# Altium schematic symbol library IC_TI.SCHLIB: 1162 symbols (part 2 of 8) (continued)
## DP83848KSQ_NOPB (continued)

## DP83848TSQ_NOPB
designator U?
Integrated Circuit; Manufacturer_Name: Texas Instruments; Manufacturer_Part_Number: DP83848TSQ/NOPB; Datasheet Link: http://www.ti.com/lit/gpn/dp83848t; Height: 0.8mm; Mouser Part Number: 926-DP83848TSQ/NOPB; Mouser Price/Stock: https://www.mouser.com/Search/Refine.aspx?Keyword=926-DP83848TSQ%2FNOPB; RS Part Number: 7614760; RS Price/Stock: https://uk.rs-online.com/web/p/products/7614760
footprint QFN40_0.5-PAD(6X6) (QFN, 40-Leads, Body 6.2x6.2mm (max), Pitch 0.50mm, IPC Low Density)
pins: 1 IO_VDD, 2 TX_CLK, 3 TX_EN, 4 TXD_0, 5 TXD_1, 6 TXD_2, 7 TXD_3, 8 RESERVED_1, 9 RESERVED_2, 10 RESERVED_3, 11 RD-, 12 RD+, 13 AGND_1, 14 TD-, 15 TD+, 16 PFBIN1, 17 AGND_2, 18 AVDD33, 19 PFBOUT, 20 RBIAS, 21 LED_SPEED/AN1, 22 LED_LINK/AN0, 23 RESET_N, 24 MDIO, 25 MDC, 26 IOVDD33, 27 X2, 28 X1, 29 DGND, 30 PFBIN2, 31 RX_CLK, 32 RX_DV/MII_MODE, 33 CRS/CRS_DV/LED_CFG, 34 RX_ER/MDIX_EN, 35 COL/PHYAD0, 36 RXD_0/PHYAD1, 37 RXD_1/PHYAD2, 38 RXD_2/PHYAD3, 39 RXD_3/PHYAD4, 40 IOGND, 41 EPAD

## DRV632PWR
designator U?
Integrated Circuit; Manufacturer_Name: Texas Instruments; Manufacturer_Part_Number: DRV632PWR; Datasheet Link: http://www.ti.com/lit/gpn/drv632; Mouser Part Number: 595-DRV632PWR; Mouser Price/Stock: https://www.mouser.com/Search/Refine.aspx?Keyword=595-DRV632PWR
footprint TSSOP14_0.65 (TSOP, 14-Leads, Body 5.00x4.40mm, Pitch 0.65mm, Thermal Pad 2.31x2.46mm, IPC Low Density)
pins: 1 +INR, 2 -INR, 3 OUTR, 4 GND_2, 5 ~MUTE, 6 VSS, 7 CN, 8 CP, 9 VDD, 10 GND, 11 UVP, 12 OUTL, 13 -INL, 14 +INL

## DRV2605LDGST
designator U?
Integrated Circuit; Manufacturer_Name: Texas Instruments; Manufacturer_Part_Number: DRV2605LDGST; Datasheet Link: http://www.ti.com/lit/ds/symlink/drv2605l.pdf; Height: 1.1mm; Mouser Part Number: 595-DRV2605LDGST; Mouser Price/Stock: https://www.mouser.com/Search/Refine.aspx?Keyword=595-DRV2605LDGST; RS Part Number: 9142942P; RS Price/Stock: http://uk.rs-online.com/web/p/products/9142942P
footprint VSSOP10_0.5
pins: 1 REG, 2 SCL, 3 SDA, 4 IN/TRIG, 5 EN, 6 VDD/NC, 7 OUT+, 8 GND, 9 OUT-, 10 VDD

## DRV5053VAQDBZR
designator U?
Integrated Circuit; Manufacturer_Name: Texas Instruments; Manufacturer_Part_Number: DRV5053VAQDBZR; Datasheet Link: http://www.ti.com/lit/ds/symlink/drv5053.pdf; Height: 1.12mm; Mouser Part Number: 595-DRV5053VAQDBZR; Mouser Price/Stock: https://www.mouser.com/Search/Refine.aspx?Keyword=595-DRV5053VAQDBZR
footprint SOT23-3 (贴片MOS的SOT-23封装)
pins: 1 VCC, 2 OUT, 3 GND

## DRV8313PWP
designator U?
Integrated Circuit; Manufacturer_Name: Texas Instruments; Manufacturer_Part_Number: DRV8313PWP; Datasheet Link: http://www.ti.com/lit/gpn/drv8313; Height: 1.2mm; Mouser Part Number: 595-DRV8313PWP; Mouser Price/Stock: https://www.mouser.com/Search/Refine.aspx?Keyword=595-DRV8313PWP; RS Part Number: 1457432; RS Price/Stock: http://uk.rs-online.com/web/p/products/1457432
footprint TSSOP28_0.65-PAD
pins: 1 CPL, 2 CPH, 3 VCP, 4 VM_1, 5 OUT1, 6 PGND1, 7 PGND2, 8 OUT2, 9 OUT3, 10 PGND3, 11 VM_2, 12 COMPP, 13 COMPN, 14 GND_1, 15 V3P3, 16 NRESET, 17 NSLEEP, 18 NFAULT, 19 NCOMPO, 20 GND_2, 21 NC, 22 EN3, 23 IN3, 24 EN2, 25 IN2, 26 EN1, 27 IN1, 28 GND_3, 29 POWERPAD

## DRV8313RHHR
designator U?
Integrated Circuit; Manufacturer_Name: Texas Instruments; Manufacturer_Part_Number: DRV8313RHHR; Datasheet Link: http://www.ti.com/lit/ds/symlink/drv8313.pdf; Height: 1mm; Mouser Part Number: 595-DRV8313RHHR; Mouser Price/Stock: https://www.mouser.com/Search/Refine.aspx?Keyword=595-DRV8313RHHR
footprint QFN36_0.5-PAD(6X6)
pins: 1 EN1, 2 IN1, 3 GND_1, 4 NC_1, 5 CPL, 6 CPH, 7 VCP, 8 NC_2, 9 VM_1, 10 OUT1, 11 PGND1, 12 PGND2, 13 OUT2, 14 NC_3, 15 OUT3, 16 PGND3, 17 GND_2, 18 RSVD, 19 VM_2, 20 GND_3, 21 COMPP, 22 COMPN, 23 GND_4, 24 GND_5, 25 V3P3, 26 NRESET, 27 NSLEEP, 28 NFAULT, 29 NCOMPO, 30 GND_6, 31 GND_7, 32 GND_8, 33 EN3, 34 IN3, 35 EN2, 36 IN2, 37 EP

## DRV8800PWPR
designator U?
Integrated Circuit; Manufacturer_Name: Texas Instruments; Manufacturer_Part_Number: DRV8800PWPR; Datasheet Link: http://www.ti.com/lit/gpn/drv8800; Mouser Part Number: 595-DRV8800PWPR; Mouser Price/Stock: https://www.mouser.com/Search/Refine.aspx?Keyword=595-DRV8800PWPR
footprint TSSOP16_0.65-PAD (Shrink Small Outline; 16 Leads; Body Width 4.4 mm; Pitch 0.65 mm)
pins: 1 NFAULT, 2 MODE, 3 PHASE, 4 GND_2, 5 NSLEEP, 6 ENABLE, 7 OUT+, 8 SENSE, 9 VBB, 10 OUT-, 11 CP1, 12 CP2, 13 GND, 14 VCP, 15 VREG, 16 NC, 17 EPAD

## DRV8811PWP
designator U?
Integrated Circuit; Manufacturer_Name: Texas Instruments; Manufacturer_Part_Number: DRV8811PWP; Datasheet Link: http://www.ti.com/lit/gpn/drv8811; Mouser Part Number: 595-DRV8811PWP; Mouser Price/Stock: https://www.mouser.com/Search/Refine.aspx?Keyword=595-DRV8811PWP; RS Part Number: 1626147; RS Price/Stock: http://uk.rs-online.com/web/p/products/1626147
footprint TSSOP28_0.65-PAD
pins: 1 ISENA, 2 HOME, 3 DIR, 4 AOUT1, 5 DECAY, 6 RCA, 7 GND_2, 8 VREF, 9 RCB, 10 VCC, 11 BOUT1, 12 USM1, 13 USM0, 14 ISENB, 15 VMB, 16 SRN, 17 RESETN, 18 BOUT2, 19 STEP, 20 VGD, 21 GND, 22 VCP, 23 CP1, 24 CP2, 25 AOUT2, 26 ENABLEN, 27 SLEEPN, 28 VMA, 29 EP

## DRV8812PWPR
designator U?
Integrated Circuit; Manufacturer_Name: Texas Instruments; Manufacturer_Part_Number: DRV8812PWPR; Datasheet Link: http://www.ti.com/lit/gpn/drv8812; Mouser Part Number: 595-DRV8812PWPR; Mouser Price/Stock: https://www.mouser.com/Search/Refine.aspx?Keyword=595-DRV8812PWPR
footprint TSSOP28_0.65-PAD
pins: 1 CP1, 2 CP2, 3 VCP, 4 VMA, 5 AOUT1, 6 ISENA, 7 AOUT2, 8 BOUT2, 9 ISENB, 10 BOUT1, 11 VMB, 12 AVREF, 13 BVREF, 14 GND_2, 15 V3P3OUT, 16 NRESET, 17 NSLEEP, 18 NFAULT, 19 DECAY, 20 APHASE, 21 AENBL, 22 BENBL, 23 BPHASE, 24 AI0, 25 AI1, 26 BI0, 27 BI1, 28 GND, 29 EPAD

## DRV8825PWP
designator M??
Motor; Manufacturer_Name: Texas Instruments; Manufacturer_Part_Number: DRV8825PWP; Datasheet Link: http://www.ti.com/lit/ds/symlink/drv8825.pdf; Height: 1.2mm; Mouser Part Number: 595-DRV8825PWP; Mouser Price/Stock: https://www.mouser.com/Search/Refine.aspx?Keyword=595-DRV8825PWP; RS Part Number: 7422873P; RS Price/Stock: http://uk.rs-online.com/web/p/products/7422873P
footprint TSSOP28_0.65-PAD
pins: 1 CP1, 2 CP2, 3 VCP, 4 VMA, 5 AOUT1, 6 ISEN1, 7 AOUT2, 8 BOUT2, 9 ISENB, 10 BOUT1, 11 VMB, 12 AVREF, 13 BVREF, 14 GND_1 (power), 15 V3P3OUT, 16 NRESET, 17 NSLEEP, 18 NFAULT, 19 DECAY, 20 DIR, 21 NENBL, 22 STEP, 23 NC, 24 MODE0, 25 MODE1, 26 MODE2, 27 NHOME, 28 GND_2 (power), 29 TP

## DRV8825PWPR
designator U?
Integrated Circuit; Manufacturer_Name: Texas Instruments; Manufacturer_Part_Number: DRV8825PWPR; Datasheet Link: http://www.ti.com/lit/gpn/drv8825; Height: 1.2mm; Mouser Part Number: 595-DRV8825PWPR; Mouser Price/Stock: https://www.mouser.com/Search/Refine.aspx?Keyword=595-DRV8825PWPR
footprint TSSOP28_0.65-PAD
pins: 1 CP1, 2 CP2, 3 VCP, 4 VMA, 5 AOUT1, 6 ISENA, 7 AOUT2, 8 BOUT2, 9 ISENB, 10 BOUT1, 11 VMB, 12 AVREF, 13 BVREF, 14 GND_1, 15 VEP3OUT, 16 NRESET, 17 NSLEEP, 18 NFAULT, 19 DECAY, 20 DIR, 21 NENBL, 22 STEP, 23 NC, 24 MODE0, 25 MODE1, 26 MODE2, 27 NHOME, 28 GND_2, 29 EP

## DRV8832DGQ
designator U?
Integrated Circuit; Manufacturer_Name: Texas Instruments; Manufacturer_Part_Number: DRV8832DGQ; Datasheet Link: http://datasheet.octopart.com/DRV8832DGQ-Texas-Instruments-datasheet-10258026.pdf; Height: 1.1mm; Mouser Part Number: 595-DRV8832DGQ; Mouser Price/Stock: https://www.mouser.com/Search/Refine.aspx?Keyword=595-DRV8832DGQ; RS Part Number: 1626150; RS Price/Stock: http://uk.rs-online.com/web/p/products/1626150
footprint VSSOP10_0.5-PAD
pins: 1 OUT2, 2 ISENSE, 3 OUT1, 4 VCC, 5 GND, 6 FAULTN, 7 VSET, 8 VREF, 9 IN1, 10 IN2, 11 TP

## DRV8833PW
designator U?
Integrated Circuit; Manufacturer_Name: Texas Instruments; Manufacturer_Part_Number: DRV8833PW; Datasheet Link: http://www.ti.com/lit/ds/symlink/drv8833.pdf; Height: 1.2mm; Mouser Part Number: 595-DRV8833PW; Mouser Price/Stock: https://www.mouser.com/Search/Refine.aspx?Keyword=595-DRV8833PW
footprint TSSOP16_0.65 (Shrink Small Outline; 16 Leads; Body Width 4.4 mm; Pitch 0.65 mm)
pins: 1 NSLEEP, 2 AOUT1, 3 AISEN, 4 AOUT2, 5 BOUT2, 6 BISEN, 7 BOUT1, 8 NFAULT, 9 BIN1, 10 BIN2, 11 VCP, 12 VM, 13 GND, 14 VINT, 15 AIN2, 16 AIN1

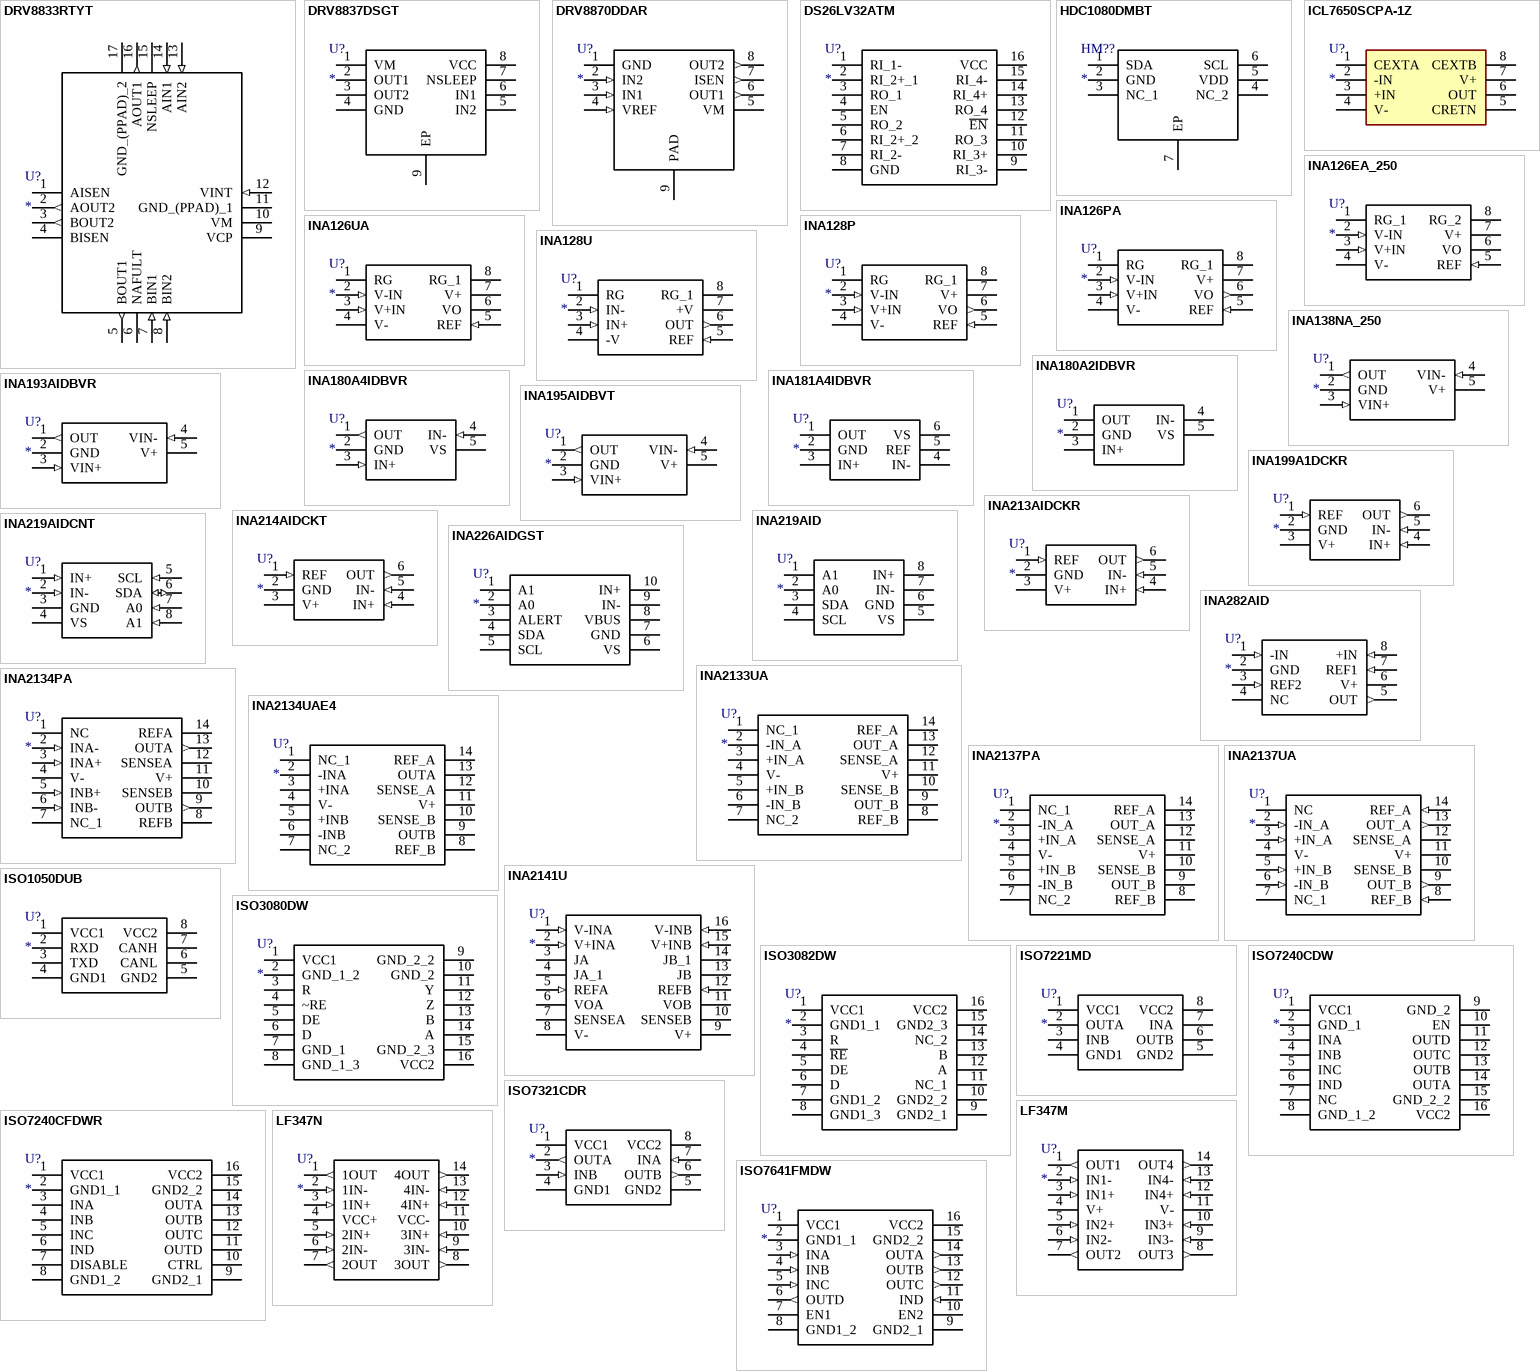
[diagram p6: symbols DRV8833RTYT to LF347N]

## DRV8833RTYT
designator U?
Integrated Circuit; Manufacturer_Name: Texas Instruments; Manufacturer_Part_Number: DRV8833RTYT; Datasheet Link: http://www.ti.com/lit/ds/symlink/drv8833.pdf; Height: 0.8mm; Mouser Part Number: 595-DRV8833RTYT; Mouser Price/Stock: https://www.mouser.com/Search/Refine.aspx?Keyword=595-DRV8833RTYT; RS Part Number: 8136481P; RS Price/Stock: http://uk.rs-online.com/web/p/products/8136481P
footprint QFN16_0.65-PAD(4x4) (QFN, 16-Leads, Body 3.0x3.0mm (max), Pitch 0.50mm, IPC Low Density)
pins: 1 AISEN, 2 AOUT2 (out), 3 BOUT2 (out), 4 BISEN, 5 BOUT1 (out), 6 NAFULT, 7 BIN1 (in), 8 BIN2 (in), 9 VCP, 10 VM, 11 GND_(PPAD)_1 (power), 12 VINT (in), 13 AIN2 (in), 14 AIN1 (in), 15 NSLEEP, 16 AOUT1 (out), 17 GND_(PPAD)_2 (power)

## DRV8837DSGT
designator U?
Integrated Circuit; Manufacturer_Name: Texas Instruments; Manufacturer_Part_Number: DRV8837DSGT; Datasheet Link: http://www.ti.com/lit/ds/symlink/drv8837.pdf; Height: 0.8mm; Mouser Part Number: 595-DRV8837DSGT; Mouser Price/Stock: https://www.mouser.com/Search/Refine.aspx?Keyword=595-DRV8837DSGT; RS Part Number: 1627674; RS Price/Stock: http://uk.rs-online.com/web/p/products/1627674
footprint DFN8_0.5-PAD(2X2) (DFN8_0.5-PAD(3X3))
pins: 1 VM, 2 OUT1, 3 OUT2, 4 GND, 5 IN2, 6 IN1, 7 NSLEEP, 8 VCC, 9 EP

## DRV8870DDAR
designator U?
Integrated Circuit; Manufacturer_Name: Texas Instruments; Manufacturer_Part_Number: DRV8870DDAR; Datasheet Link: https://componentsearchengine.com/Datasheets/2/DRV8870DDAR.pdf; Height: 1.7mm; Mouser Part Number: 595-DRV8870DDAR; Mouser Price/Stock: https://www.mouser.com/Search/Refine.aspx?Keyword=595-DRV8870DDAR
footprint SOIC8_1.27-PAD
pins: 1 GND (power), 2 IN2 (in), 3 IN1 (in), 4 VREF (in), 5 VM (power), 6 OUT1 (out), 7 ISEN (out), 8 OUT2 (out), 9 PAD (power)

## DS26LV32ATM
designator U?
Integrated Circuit; Manufacturer_Name: Texas Instruments; Manufacturer_Part_Number: DS26LV32ATM; Datasheet Link: http://www.ti.com/lit/ds/symlink/ds26lv32at.pdf; Height: 1.75mm; Mouser Part Number: 926-DS26LV32ATM; Mouser Price/Stock: https://www.mouser.com/Search/Refine.aspx?Keyword=926-DS26LV32ATM; RS Part Number: 4698516
footprint SOIC16_1.27
pins: 1 RI_1-, 2 RI_2+_1, 3 RO_1, 4 EN, 5 RO_2, 6 RI_2+_2, 7 RI_2-, 8 GND (power), 9 RI_3-, 10 RI_3+, 11 RO_3, 12 ~{EN}, 13 RO_4, 14 RI_4+, 15 RI_4-, 16 VCC (power)

## HDC1080DMBT
designator HM??
Hygrometer; Manufacturer_Name: Texas Instruments; Manufacturer_Part_Number: HDC1080DMBT; Datasheet Link: http://www.mouser.com/ds/2/405/hdc1080-844688.pdf; Height: 0.8mm; Mouser Part Number: 595-HDC1080DMBT; Mouser Price/Stock: https://www.mouser.com/Search/Refine.aspx?Keyword=595-HDC1080DMBT; RS Part Number: 1684955; RS Price/Stock: http://uk.rs-online.com/web/p/products/1684955
footprint DFN6_1.0-PAD(3X3)
pins: 1 SDA, 2 GND (power), 3 NC_1, 4 NC_2, 5 VDD (power), 6 SCL, 7 EP (power)

## ICL7650SCPA-1Z
designator U?
Integrated Circuit; Manufacturer_Name: Intersil; Manufacturer_Part_Number: ICL7650SCPA-1Z; Mouser Part Number: 968-ICL7650SCPA-1Z; Mouser Price/Stock: http://www.mouser.com/Search/ProductDetail.aspx?qs=9fLuogzTs8KAAeGhsmiqoQ%3d%3d; RS Part Number: 7044580P; RS Price/Stock: http://uk.rs-online.com/web/p/products/7044580P
footprint DIP8
pins: 1 CEXTA, 2 -IN, 3 +IN, 4 V-, 5 CRETN, 6 OUT, 7 V+, 8 CEXTB

## INA126EA_250
designator U?
Integrated Circuit; Manufacturer_Name: Texas Instruments; Manufacturer_Part_Number: INA126EA/250; Datasheet Link: http://www.ti.com/lit/ds/symlink/ina126.pdf; Height: 1.1mm; Mouser Part Number: 595-INA126EA/250; Mouser Price/Stock: https://www.mouser.com/Search/Refine.aspx?Keyword=595-INA126EA%2F250; RS Part Number: 9223227; RS Price/Stock: http://uk.rs-online.com/web/p/products/9223227
footprint VSSOP8_0.65-PAD
pins: 1 RG_1, 2 V-IN (in), 3 V+IN (in), 4 V-, 5 REF (in), 6 VO, 7 V+, 8 RG_2

## INA126PA
designator U?
Integrated Circuit; Manufacturer_Name: Texas Instruments; Manufacturer_Part_Number: INA126PA; Datasheet Link: http://www.ti.com/lit/ds/symlink/ina126.pdf; Height: 5.08mm; Mouser Part Number: 595-INA126PA; Mouser Price/Stock: https://www.mouser.com/Search/Refine.aspx?Keyword=595-INA126PA; RS Part Number: 2521616P; RS Price/Stock: http://uk.rs-online.com/web/p/products/2521616P
footprint DIP8-A
pins: 1 RG, 2 V-IN (in), 3 V+IN (in), 4 V- (power), 5 REF (in), 6 VO (out), 7 V+ (power), 8 RG_1

## INA126UA
designator U?
Integrated Circuit; Manufacturer_Name: Texas Instruments; Manufacturer_Part_Number: INA126UA; Datasheet Link: http://docs-emea.rs-online.com/webdocs/00a4/0900766b800a4bb3.pdf; Height: 1.75mm; Mouser Part Number: 595-INA126UA; Mouser Price/Stock: https://www.mouser.com/Search/Refine.aspx?Keyword=595-INA126UA; RS Part Number: 3697073; RS Price/Stock: http://uk.rs-online.com/web/p/products/3697073
footprint SOIC8_1.27 (SOP, 8-Leads, Pitch 1.27mm)
pins: 1 RG, 2 V-IN (in), 3 V+IN (in), 4 V-, 5 REF (in), 6 VO, 7 V+, 8 RG_1

## INA128P
designator U?
Integrated Circuit; Manufacturer_Name: Texas Instruments; Manufacturer_Part_Number: INA128P; Datasheet Link: http://www.ti.com/lit/ds/symlink/ina128.pdf; Height: 5.08mm; Mouser Part Number: 595-INA128P; Mouser Price/Stock: https://www.mouser.com/Search/Refine.aspx?Keyword=595-INA128P; RS Part Number: 2188427P; RS Price/Stock: http://uk.rs-online.com/web/p/products/2188427P
footprint DIP8-A
pins: 1 RG, 2 V-IN (in), 3 V+IN (in), 4 V- (power), 5 REF (in), 6 VO (out), 7 V+ (power), 8 RG_1

## INA128U
designator U?
Integrated Circuit; Manufacturer_Name: Texas Instruments; Manufacturer_Part_Number: INA128U; Datasheet Link: http://docs-emea.rs-online.com/webdocs/0cae/0900766b80caef3c.pdf; Height: 1.75mm; Mouser Part Number: 595-INA128U; Mouser Price/Stock: https://www.mouser.com/Search/Refine.aspx?Keyword=595-INA128U; RS Part Number: 6606525P; RS Price/Stock: http://uk.rs-online.com/web/p/products/6606525P
footprint SOIC8_1.27 (SOP, 8-Leads, Pitch 1.27mm)
pins: 1 RG, 2 IN- (in), 3 IN+ (in), 4 -V, 5 REF (in), 6 OUT (out), 7 +V, 8 RG_1

## INA138NA_250
designator U?
Integrated Circuit; Manufacturer_Name: Texas Instruments; Manufacturer_Part_Number: INA138NA/250; Datasheet Link: http://www.ti.com/lit/ds/symlink/ina138.pdf; Height: 1.45mm; Mouser Part Number: 595-INA138NA/250; Mouser Price/Stock: https://www.mouser.com/Search/Refine.aspx?Keyword=595-INA138NA%2F250; RS Part Number: 3782755P; RS Price/Stock: http://uk.rs-online.com/web/p/products/3782755P
footprint SOT23-5 (SOT23, 5-Leads, Body 3.0x3.0mm (max), Pitch 0.95mm, IPC Medium Density)
pins: 1 OUT (out), 2 GND (power), 3 VIN+ (in), 4 VIN- (in), 5 V+

## INA180A2IDBVR
designator U?
Integrated Circuit; Manufacturer_Name: Texas Instruments; Manufacturer_Part_Number: INA180A2IDBVR; Datasheet Link: http://www.ti.com/lit/ds/symlink/ina180.pdf; Height: 1.45mm; Mouser Part Number: 595-INA180A2IDBVR; Mouser Price/Stock: https://www.mouser.com/Search/Refine.aspx?Keyword=595-INA180A2IDBVR
footprint SOT23-5 (SOT23, 5-Leads, Body 3.0x3.0mm (max), Pitch 0.95mm, IPC Medium Density)
pins: 1 OUT, 2 GND, 3 IN+, 4 IN-, 5 VS

## INA180A4IDBVR
designator U?
Integrated Circuit; Manufacturer_Name: Texas Instruments; Manufacturer_Part_Number: INA180A4IDBVR; Datasheet Link: http://www.ti.com/lit/ds/symlink/ina180.pdf; Height: 1.45mm; Mouser Part Number: 595-INA180A4IDBVR; Mouser Price/Stock: https://www.mouser.com/Search/Refine.aspx?Keyword=595-INA180A4IDBVR
footprint SOT23-5 (SOT23, 5-Leads, Body 3.0x3.0mm (max), Pitch 0.95mm, IPC Medium Density)
pins: 1 OUT (out), 2 GND (power), 3 IN+ (in), 4 IN- (in), 5 VS (power)

## INA181A4IDBVR
designator U?
Integrated Circuit; Manufacturer_Name: Texas Instruments; Manufacturer_Part_Number: INA181A4IDBVR; Datasheet Link: http://www.ti.com/lit/ds/symlink/ina181.pdf; Height: 1.45mm; Mouser Part Number: 595-INA181A4IDBVR; Mouser Price/Stock: https://www.mouser.com/Search/Refine.aspx?Keyword=595-INA181A4IDBVR
footprint SOT23-6
pins: 1 OUT, 2 GND, 3 IN+, 4 IN-, 5 REF, 6 VS

## INA193AIDBVR
designator U?
Integrated Circuit; Manufacturer_Name: Texas Instruments; Manufacturer_Part_Number: INA193AIDBVR; Datasheet Link: http://www.ti.com/lit/ds/symlink/ina193.pdf; Height: 1.45mm; Mouser Part Number: 595-INA193AIDBVR; Mouser Price/Stock: https://www.mouser.com/Search/Refine.aspx?Keyword=595-INA193AIDBVR; RS Part Number: 6518125P; RS Price/Stock: http://uk.rs-online.com/web/p/products/6518125P
footprint SOT23-5 (SOT23, 5-Leads, Body 3.0x3.0mm (max), Pitch 0.95mm, IPC Medium Density)
pins: 1 OUT (out), 2 GND (power), 3 VIN+ (in), 4 VIN- (in), 5 V+

## INA195AIDBVT
designator U?
Integrated Circuit; Manufacturer_Name: Texas Instruments; Manufacturer_Part_Number: INA195AIDBVT; Datasheet Link: http://www.ti.com/lit/ds/symlink/ina195.pdf; Height: 1.45mm; Mouser Part Number: 595-INA195AIDBVT; Mouser Price/Stock: http://www.mouser.com/Search/ProductDetail.aspx?qs=VBduBm9rCJRLA1l7eoR9Lw%3d%3d; RS Part Number: 1218922; RS Price/Stock: http://uk.rs-online.com/web/p/products/1218922
footprint SOT23-5 (SOT23, 5-Leads, Body 3.0x3.0mm (max), Pitch 0.95mm, IPC Medium Density)
pins: 1 OUT (out), 2 GND (power), 3 VIN+ (in), 4 VIN- (in), 5 V+

## INA199A1DCKR
designator U?
Integrated Circuit; Manufacturer_Name: Texas Instruments; Manufacturer_Part_Number: INA199A1DCKR; Datasheet Link: http://www.ti.com/lit/ds/symlink/ina199.pdf; Height: 1.1mm; Mouser Part Number: 595-INA199A1DCKR; Mouser Price/Stock: https://www.mouser.com/Search/Refine.aspx?Keyword=595-INA199A1DCKR
footprint SOT363
pins: 1 REF (in), 2 GND (power), 3 V+, 4 IN+ (in), 5 IN- (in), 6 OUT (out)

## INA213AIDCKR
designator U?
Integrated Circuit; Manufacturer_Name: Texas Instruments; Manufacturer_Part_Number: INA213AIDCKR; Datasheet Link: http://docs-emea.rs-online.com/webdocs/132a/0900766b8132ad8a.pdf; Height: 1.1mm; Mouser Part Number: 595-INA213AIDCKR; Mouser Price/Stock: https://www.mouser.com/Search/Refine.aspx?Keyword=595-INA213AIDCKR; RS Part Number: 1684361; RS Price/Stock: http://uk.rs-online.com/web/p/products/1684361
footprint SOT363
pins: 1 REF (in), 2 GND (power), 3 V+ (power), 4 IN+ (in), 5 IN- (in), 6 OUT (out)

## INA214AIDCKT
designator U?
Integrated Circuit; Manufacturer_Name: Texas Instruments; Manufacturer_Part_Number: INA214AIDCKT; Datasheet Link: http://www.ti.com/lit/ds/symlink/ina214.pdf; Height: 1.1mm; Mouser Part Number: 595-INA214AIDCKT; Mouser Price/Stock: https://www.mouser.com/Search/Refine.aspx?Keyword=595-INA214AIDCKT; RS Part Number: 7094538; RS Price/Stock: http://uk.rs-online.com/web/p/products/7094538
footprint SOT363
pins: 1 REF (in), 2 GND (power), 3 V+, 4 IN+ (in), 5 IN- (in), 6 OUT (out)

## INA219AID
designator U?
Integrated Circuit; Manufacturer_Name: Texas Instruments; Manufacturer_Part_Number: INA219AID; Datasheet Link: http://www.ti.com/lit/ds/symlink/ina219.pdf; Height: 1.75mm; Mouser Part Number: 595-INA219AID; Mouser Price/Stock: https://www.mouser.com/Search/Refine.aspx?Keyword=595-INA219AID; RS Part Number: 8176580P; RS Price/Stock: http://uk.rs-online.com/web/p/products/8176580P
footprint SOIC8_1.27 (SOP, 8-Leads, Pitch 1.27mm)
pins: 1 A1, 2 A0, 3 SDA, 4 SCL, 5 VS, 6 GND, 7 IN-, 8 IN+

## INA219AIDCNT
designator U?
Integrated Circuit; Manufacturer_Name: Texas Instruments; Manufacturer_Part_Number: INA219AIDCNT; Datasheet Link: http://www.ti.com/lit/gpn/ina219; Height: 1.45mm; Mouser Part Number: 595-INA219AIDCNT; Mouser Price/Stock: https://www.mouser.com/Search/Refine.aspx?Keyword=595-INA219AIDCNT; RS Part Number: 7098855P; RS Price/Stock: http://uk.rs-online.com/web/p/products/7098855P
footprint SOT23-8 (TSOP, 8-Leads, Body 2.9x1.6mm (max), Pitch 0.65mm, IPC Medium Density)
pins: 1 IN+ (in), 2 IN- (in), 3 GND (power), 4 VS (power), 5 SCL (in), 6 SDA (io), 7 A0 (in), 8 A1 (in)

## INA226AIDGST
designator U?
Integrated Circuit; Manufacturer_Name: Texas Instruments; Manufacturer_Part_Number: INA226AIDGST; Datasheet Link: http://www.ti.com/lit/gpn/ina226; Height: 1.1mm; Mouser Part Number: 595-INA226AIDGST; Mouser Price/Stock: https://www.mouser.com/Search/Refine.aspx?Keyword=595-INA226AIDGST; RS Part Number: 7422889P; RS Price/Stock: http://uk.rs-online.com/web/p/products/7422889P
footprint VSSOP10_0.5
pins: 1 A1, 2 A0, 3 ALERT, 4 SDA, 5 SCL, 6 VS, 7 GND, 8 VBUS, 9 IN-, 10 IN+

## INA282AID
designator U?
Integrated Circuit; Manufacturer_Name: Texas Instruments; Manufacturer_Part_Number: INA282AID; Datasheet Link: http://www.ti.com/lit/ds/symlink/ina282.pdf; Height: 1.75mm; Mouser Part Number: 595-INA282AID; Mouser Price/Stock: https://www.mouser.com/Search/Refine.aspx?Keyword=595-INA282AID; RS Part Number: 8176603P; RS Price/Stock: http://uk.rs-online.com/web/p/products/8176603P
footprint SOIC8_1.27 (SOP, 8-Leads, Pitch 1.27mm)
pins: 1 -IN (in), 2 GND (power), 3 REF2 (in), 4 NC, 5 OUT (out), 6 V+, 7 REF1 (in), 8 +IN (in)

## INA2133UA
designator U?
Integrated Circuit; Manufacturer_Name: Texas Instruments; Manufacturer_Part_Number: INA2133UA; Datasheet Link: http://www.ti.com/lit/ds/symlink/ina2133.pdf; Height: 1.75mm; Mouser Part Number: 595-INA2133UA; Mouser Price/Stock: https://www.mouser.com/Search/Refine.aspx?Keyword=595-INA2133UA; RS Part Number: 1218535; RS Price/Stock: http://uk.rs-online.com/web/p/products/1218535
footprint SOIC14_1.27
pins: 1 NC_1, 2 -IN_A, 3 +IN_A, 4 V-, 5 +IN_B, 6 -IN_B, 7 NC_2, 8 REF_B, 9 OUT_B, 10 SENSE_B, 11 V+, 12 SENSE_A, 13 OUT_A, 14 REF_A

## INA2134PA
designator U?
Integrated Circuit; Manufacturer_Name: Texas Instruments; Manufacturer_Part_Number: INA2134PA; Datasheet Link: http://www.ti.com/lit/gpn/ina2134; Height: 5.08mm; Mouser Part Number: 595-INA2134PA; Mouser Price/Stock: https://www.mouser.com/Search/Refine.aspx?Keyword=595-INA2134PA; RS Part Number: 1624188; RS Price/Stock: http://uk.rs-online.com/web/p/products/1624188
footprint DIP14-A
pins: 1 NC, 2 INA- (in), 3 INA+ (in), 4 V- (power), 5 INB+ (in), 6 INB- (in), 7 NC_1, 8 REFB, 9 OUTB (out), 10 SENSEB, 11 V+ (power), 12 SENSEA, 13 OUTA (out), 14 REFA

## INA2134UAE4
designator U?
Integrated Circuit; Manufacturer_Name: Texas Instruments; Manufacturer_Part_Number: INA2134UAE4; Datasheet Link: http://www.ti.com/lit/ds/symlink/iso122.pdf; Height: 1.75mm; Mouser Part Number: 595-INA2134UAE4; Mouser Price/Stock: https://www.mouser.com/Search/Refine.aspx?Keyword=595-INA2134UAE4; RS Part Number: 1627264; RS Price/Stock: http://uk.rs-online.com/web/p/products/1627264
footprint SOIC14_1.27
pins: 1 NC_1, 2 -INA, 3 +INA, 4 V-, 5 +INB, 6 -INB, 7 NC_2, 8 REF_B, 9 OUTB, 10 SENSE_B, 11 V+, 12 SENSE_A, 13 OUTA, 14 REF_A

## INA2137PA
designator U?
Integrated Circuit; Manufacturer_Name: Texas Instruments; Manufacturer_Part_Number: INA2137PA; Datasheet Link: http://www.ti.com/lit/gpn/ina2137; Height: 5.08mm; Mouser Part Number: 595-INA2137PA; Mouser Price/Stock: https://www.mouser.com/Search/Refine.aspx?Keyword=595-INA2137PA; RS Part Number: 1625368; RS Price/Stock: http://uk.rs-online.com/web/p/products/1625368
footprint DIP14-A
pins: 1 NC_1, 2 -IN_A, 3 +IN_A, 4 V-, 5 +IN_B, 6 -IN_B, 7 NC_2, 8 REF_B, 9 OUT_B, 10 SENSE_B, 11 V+, 12 SENSE_A, 13 OUT_A, 14 REF_A

## INA2137UA
designator U?
Integrated Circuit; Manufacturer_Name: Texas Instruments; Manufacturer_Part_Number: INA2137UA; Datasheet Link: http://www.ti.com/lit/ds/symlink/ina2137.pdf; Height: 1.75mm; Mouser Part Number: 595-INA2137UA; Mouser Price/Stock: https://www.mouser.com/Search/ProductDetail.aspx?qs=VBduBm9rCJTbmaa8O8YA7w%3d%3d; RS Part Number: 1624189; RS Price/Stock: http://uk.rs-online.com/web/p/products/1624189
footprint SOIC14_1.27
pins: 1 NC, 2 -IN_A (in), 3 +IN_A (in), 4 V-, 5 +IN_B (in), 6 -IN_B (in), 7 NC_1, 8 REF_B (in), 9 OUT_B (out), 10 SENSE_B, 11 V+, 12 SENSE_A, 13 OUT_A (out), 14 REF_A (in)

## INA2141U
designator U?
Integrated Circuit; Manufacturer_Name: Texas Instruments; Manufacturer_Part_Number: INA2141U; Datasheet Link: http://www.ti.com/lit/ds/symlink/ina2141.pdf; Height: 2.65mm; Mouser Part Number: 595-INA2141U; Mouser Price/Stock: https://www.mouser.com/Search/Refine.aspx?Keyword=595-INA2141U; RS Part Number: 1625030; RS Price/Stock: http://uk.rs-online.com/web/p/products/1625030
footprint SOIC16W_1.27
pins: 1 V-INA (in), 2 V+INA (in), 3 JA, 4 JA_1, 5 REFA (in), 6 VOA, 7 SENSEA, 8 V-, 9 V+, 10 SENSEB, 11 VOB, 12 REFB (in), 13 JB, 14 JB_1, 15 V+INB (in), 16 V-INB (in)